# Altium footprint library myLibs.PcbLib: 48 footprints (part 3 of 3)
Each footprint in its own frame and in the unit in brackets; x right, y up, seen from the top. Pads: shape width x height; smd on the part's side, far side on the other; paste and mask are expansions set on the pad; w line width, h text height; cw(c..) or ccw(c..) is an arc to the next point about the centre after c.
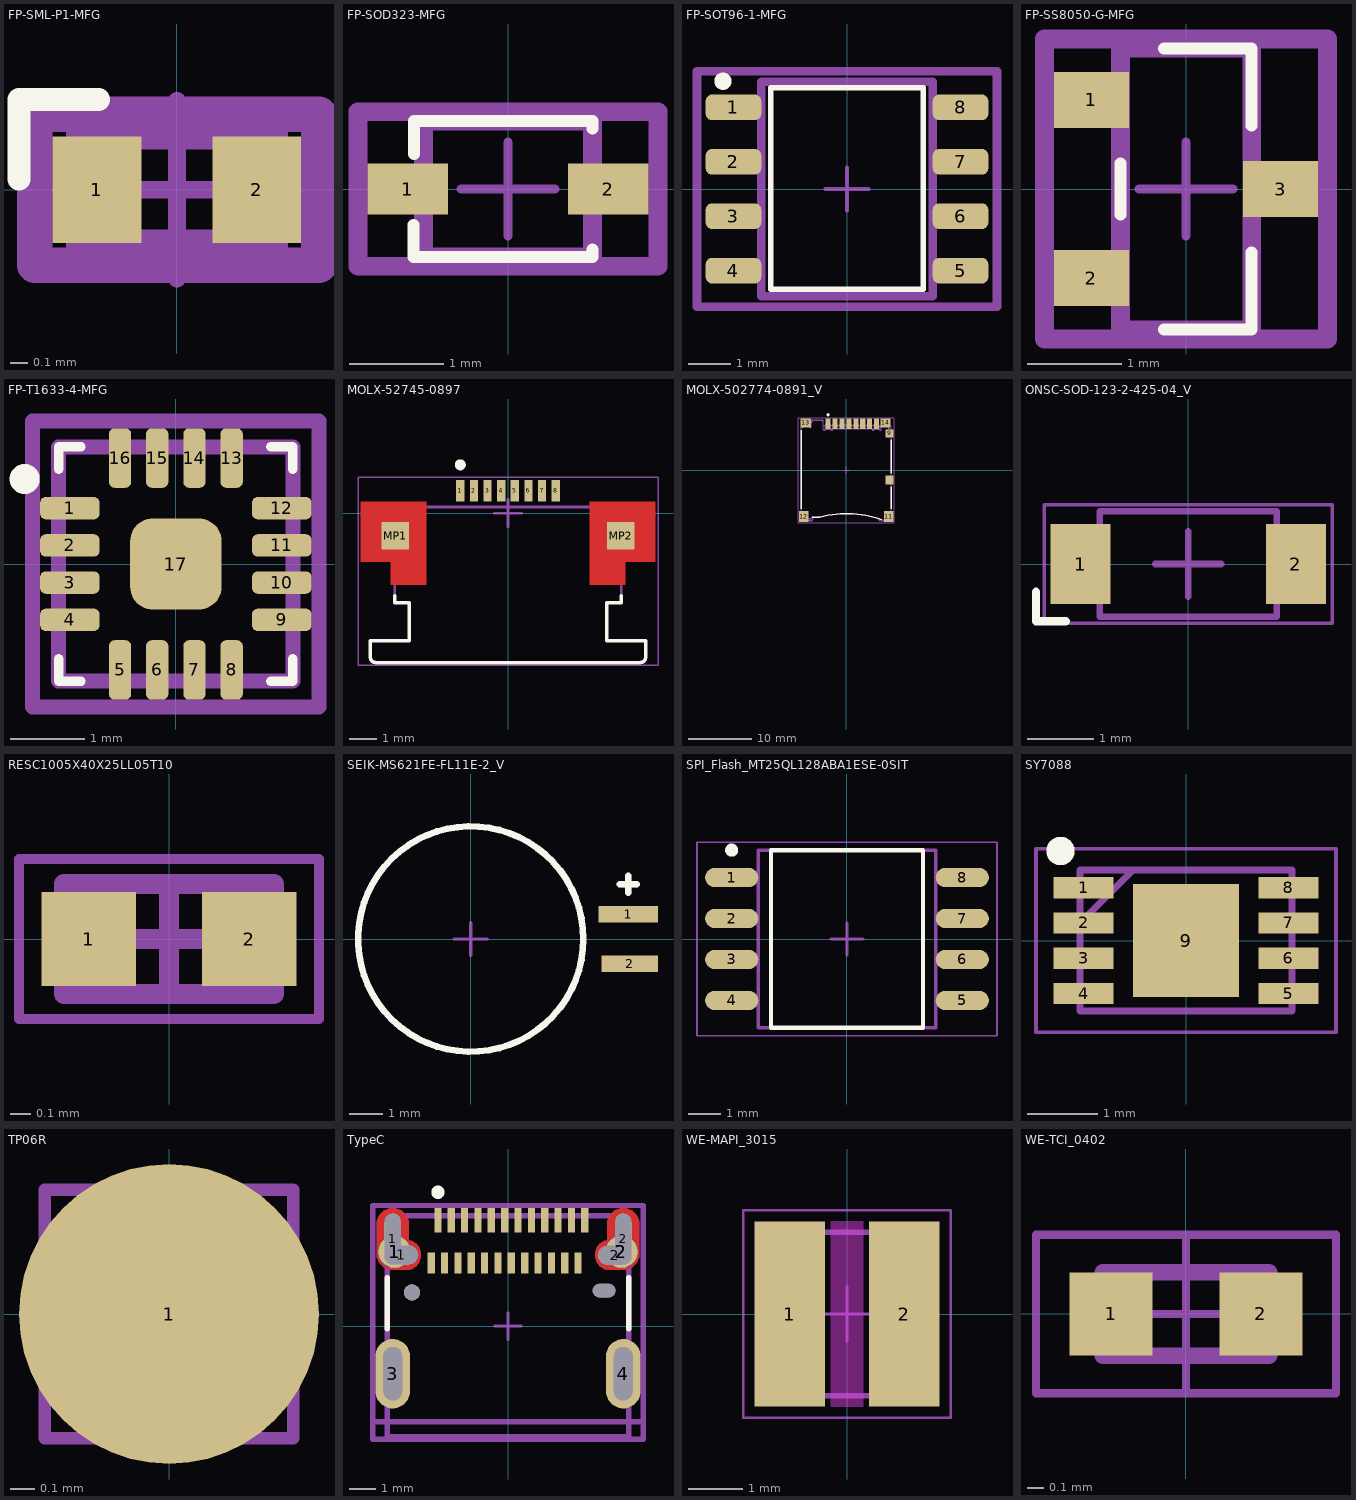
[diagram p2: the footprints below, top view; thin cyan lines are the x and y axes]

## FP-SML-P1-MFG [mm]
pads (2):
  rect 0.5x0.6 smd paste+0 mask+0: 1(-0.45,0) 2(0.45,0)
Top Overlay:
  lines w0.127: -0.889,0.058 -0.889,0.508 -0.439,0.508
Top Assembly:
  lines w0.2: -0.8,-0.425 -0.8,0.425 0.8,0.425 0.8,-0.425 -0.8,-0.425
  text ".Designator" at 0,-0.001 h1
Top 3D Body:
  lines w0.2: -0.525,-0.325 -0.525,0.325 0.525,0.325 0.525,-0.325 -0.525,-0.325
Top Courtyard:
  lines w0.2: -0.8,-0.425 -0.8,0.425 0.8,0.425 0.8,-0.425 -0.8,-0.425
Top Component Center:
  lines w0.1: -0.5,0 0.5,0 ; 0,-0.5 0,0.5
3D body "Diode_Rohm_SML-P13PTT86R_eec.STEP": height 0.25, standoff 0, extent -0.8,-0.425 0.8,0.425

## FP-SOD323-MFG [mm]
pads (2):
  rect 0.86x0.54 smd paste+0 mask+0: 1(-1.07,0) 2(1.07,0)
Top Overlay:
  lines w0.127: -1.008,-0.381 -1.008,-0.725 0.9,-0.725 0.9,-0.645 ; -1.004,0.725 0.9,0.725 0.9,0.645 ; -1.002,0.374 -1.002,0.46 -1.002,0.632 -1.002,0.718
Top Assembly:
  lines w0.2: -1.6,-0.825 1.6,-0.825 1.6,0.825 -1.6,0.825 -1.6,-0.825
  text ".Designator" at -1.778,1.204 h1
Top 3D Body:
  lines w0.2: -0.9,-0.725 0.9,-0.725 0.9,0.725 -0.9,0.725 -0.9,-0.725
Top Courtyard:
  lines w0.2: -1.6,-0.825 1.6,-0.825 1.6,0.825 -1.6,0.825 -1.6,-0.825
Top Component Center:
  lines w0.1: -0.5,0 0.5,0 ; 0,-0.5 0,0.5
3D body "IC_STMicroelectronics_BAT54JFILM_eec.STEP": height 0.25, standoff 0, extent -1.6,-0.825 1.6,0.825

## FP-SOT96-1-MFG [mm]
pads (8):
  rrect50% 1.3x0.6 smd paste+0 mask+0: 1(-2.65,1.905) 2(-2.65,0.635) 3(-2.65,-0.635) 4(-2.65,-1.905) 5(2.65,-1.905) 6(2.65,-0.635) 7(2.65,0.635) 8(2.65,1.905)
Top Overlay:
  circle w0.25: c-2.896,2.515 r0.076
  lines w0.127: -1.778,-2.337 1.778,-2.337 1.778,2.362 -1.778,2.362 -1.778,-2.337
Top Assembly:
  lines w0.2: -3.5,-2.75 -3.5,2.75 3.5,2.75 3.5,-2.75 -3.5,-2.75
  text ".Designator" at 0,0.188 h1
Top 3D Body:
  lines w0.2: -2,-2.5 -2,2.5 2,2.5 2,-2.5 -2,-2.5
Top Courtyard:
  lines w0.2: -3.5,-2.75 -3.5,2.75 3.5,2.75 3.5,-2.75 -3.5,-2.75
Top Component Center:
  lines w0.1: -0.5,0 0.5,0 ; 0,-0.5 0,0.5
3D body "IC_NXP_Semiconductors_PCF8563T-F4_118_eec.STEP": height 0.25, standoff 0, extent -3.5,-2.75 3.5,2.75

## FP-SS8050-G-MFG [mm]
pads (3):
  rect 0.8x0.6 smd paste+0 mask+0: 1(-1.01,0.95) 2(-1.01,-0.95) 3(1.01,0)
Top Overlay:
  lines w0.127: -0.7,-0.275 -0.7,0.275 ; -0.235,-1.5 0.7,-1.5 0.7,-0.675 ; -0.235,1.5 0.7,1.5 0.7,0.675
Top Assembly:
  lines w0.2: -1.51,-1.6 1.51,-1.6 1.51,1.6 -1.51,1.6 -1.51,-1.6
  text ".Designator" at 0,-0.001 h1
Top 3D Body:
  lines w0.2: -0.7,-1.5 0.7,-1.5 0.7,1.5 -0.7,1.5 -0.7,-1.5
Top Courtyard:
  lines w0.2: -1.51,-1.6 1.51,-1.6 1.51,1.6 -1.51,1.6 -1.51,-1.6
Top Component Center:
  lines w0.1: -0.5,0 0.5,0 ; 0,-0.5 0,0.5
3D body "Trans_Comchip_SS8050-G_eec.STEP": height 0.25, standoff 0, extent -1.51,-1.6 1.51,1.6

## FP-T1633-4-MFG [mm]
pads (17):
  rrect50% 0.8x0.3 smd paste+0 mask+0: 1(-1.425,0.75) 2(-1.425,0.25) 3(-1.425,-0.25) 4(-1.425,-0.75) 9(1.425,-0.75) 10(1.425,-0.25) 11(1.425,0.25) 12(1.425,0.75)
  rrect50% 0.3x0.8 smd paste+0 mask+0: 5(-0.75,-1.425) 6(-0.25,-1.425) 7(0.25,-1.425) 8(0.75,-1.425) 13(0.75,1.425) 14(0.25,1.425) 15(-0.25,1.425) 16(-0.75,1.425)
  rrect50% 1.23x1.23 smd paste+0 mask+0: 17(0,0)
Top Overlay:
  circle w0.25: c-2.032,1.143 r0.076
  lines w0.127: -1.575,-1.275 -1.575,-1.575 -1.275,-1.575 ; -1.575,1.275 -1.575,1.575 -1.275,1.575 ; 1.275,-1.575 1.575,-1.575 1.575,-1.275 ; 1.275,1.575 1.575,1.575 1.575,1.275
Top Assembly:
  lines w0.2: -1.925,-1.925 -1.925,1.925 1.925,1.925 1.925,-1.925 -1.925,-1.925
  text ".Designator" at 0,0.188 h1
Top 3D Body:
  lines w0.2: -1.575,-1.575 -1.575,1.575 1.575,1.575 1.575,-1.575 -1.575,-1.575
Top Courtyard:
  lines w0.2: -1.925,-1.925 -1.925,1.925 1.925,1.925 1.925,-1.925 -1.925,-1.925
Top Component Center:
  lines w0.1: -0.5,0 0.5,0 ; 0,-0.5 0,0.5
3D body "IC_Maxim_Integrated_MAX98357AETE+_eec.STEP": height 0.25, standoff 0, extent -1.925,-1.925 1.925,1.925

## MOLX-52745-0897 [mm]
pads (10):
  rect 0.3x0.8 smd: 1(-1.75,0.824) 2(-1.25,0.824) 3(-0.75,0.824) 4(-0.25,0.824) 5(0.25,0.824) 6(0.75,0.824) 7(1.25,0.824) 8(1.75,0.824)
  rect 1x1 smd: MP1(-4.135,-0.824) MP2(4.135,-0.824)
Top Layer:
  region: 3,0.424 5.4,0.424 5.4,-1.776 5.4,-1.777 4.3,-1.777 4.3,-2.626 3,-2.626
  region: -5.4,0.424 -3,0.424 -3,-2.626 -4.3,-2.626 -4.3,-1.777 -4.3,-1.776 -5.4,-1.776
Top Overlay:
  circle w0.25: c-1.75,1.774 r0.076
  lines w0.127: -4.15,-3.026 -4.15,-3.276 -3.625,-3.276 -3.625,-4.676 -5.05,-4.676 -5.05,-5.276 ccw(c-4.85,-5.276) -4.85,-5.476 4.85,-5.476 ccw(c4.85,-5.276) 5.05,-5.276 5.05,-4.676 3.625,-4.676 3.625,-3.276 4.15,-3.276 4.15,-3.026
Top 3D Body:
  lines w0.1: -5.05,-5.276 ccw(c-4.85,-5.276) -4.85,-5.476 4.85,-5.476 ccw(c4.85,-5.276) 5.05,-5.276 5.05,-4.676 3.625,-4.676 3.625,-3.276 4.15,-3.276 4.15,0.224 -4.15,0.224 -4.15,-3.276 -3.625,-3.276 -3.625,-4.676 -5.05,-4.676 -5.049,-4.677 -5.05,-5.276
Top Courtyard:
  lines w0.05: -5.5,-5.576 -5.5,1.324 5.5,1.324 5.5,-5.576 -5.5,-5.576
  lines w0.1: -0.5,0 0.5,0 ; 0,-0.5 0,0.5
3D body "527450897.stp": height 2.01, standoff 0.01, extent -5.05,-5.476 5.05,0.924

## MOLX-502774-0891_V [mm]
pads (14):
  rect 0.8x1.68 smd: 1(-2.9,7.385) 2(-1.8,7.385) 3(-0.7,7.385) 4(0.4,7.385) 5(1.5,7.385) 6(2.6,7.385) 7(3.7,7.385) 8(4.8,7.385)
  rect 1.29x1.3 smd: 9(6.855,5.825)
  rect 1.29x1.4 smd: 10(6.855,-1.575)
  rect 1.5x1.7 smd: 11(6.75,-7.375) 12(-6.75,-7.375)
  rect 1.7x1.5 smd: 13(-6.45,7.475)
  rect 1.6x1.5 smd: 14(6.21,7.475)
Top Overlay:
  circle w0.25: c-2.9,8.775 r0.125
  lines w0.2: -7.15,-6.125 -7.15,6.325 ; -5.41,-7.5 -4.227,-7.5 cw(c0.1,-22.801) 5.598,-7.881 ; 7.15,-6.125 7.15,-2.675 ; 7.15,-0.475 7.15,4.775
Top 3D Body:
  drawing of 232 lines, arcs and shapes, not listed
Top Courtyard:
  lines w0.05: -7.6,-8.325 7.6,-8.325 7.6,8.325 -7.6,8.325 -7.6,-8.325
  lines w0.1: -0.5,0 0.5,0 ; 0,-0.5 0,0.5
3D body "502774-0891.stp": height 1.78, standoff -0.02, extent -7.15,-8 7.15,8

## ONSC-SOD-123-2-425-04_V [mm]
pads (2):
  rect 0.91x1.22 smd: 1(-1.635,0) 2(1.635,0)
Top Overlay:
  lines w0.127: -2.314,-0.421 -2.314,-0.871 -1.864,-0.871
Top 3D Body:
  lines w0.1: -1.345,-0.8 -1.345,0.8 1.345,0.8 1.345,-0.8 -1.345,-0.8
Top Courtyard:
  lines w0.05: -2.19,-0.9 -2.19,0.9 2.19,0.9 2.19,-0.9 -2.19,-0.9
  lines w0.1: -0.5,0 0.5,0 ; 0,-0.5 0,0.5
3D body: height 1.35, standoff 0, extent -1.345,-0.8 1.345,0.8

## RESC1005X40X25LL05T10 [mm]
pads (2):
  rect 0.472x0.468 smd: 1(-0.402,0) 2(0.402,0)
Top 3D Body:
  lines w0.1: -0.525,-0.275 0.525,-0.275 0.525,0.275 -0.525,0.275 -0.525,-0.275
Top Courtyard:
  lines w0.05: -0.75,-0.4 0.75,-0.4 0.75,0.4 -0.75,0.4 -0.75,-0.4
  lines w0.1: -0.275,0 0.275,0 ; 0,-0.275 0,0.275
3D body: height 0.4, standoff 0, extent 0.275,-0.275 0.525,0.275
3D body: height 0.4, standoff 0, extent -0.525,-0.275 -0.275,0.275
3D body: height 0.4, standoff 0, extent -0.275,-0.275 0.275,0.275

## SEIK-MS621FE-FL11E-2_V [mm]
pads (2):
  rect 1.8x0.5 smd: 1(4.75,0.75)
  rect 1.7x0.5 smd: 2(4.8,-0.75)
Top Overlay:
  circle w0.2: c0,0 r3.4
  lines w0.2: 4.5,1.65 5,1.65 ; 4.75,1.4 4.75,1.9
Top 3D Body:
  circle w0.1: c0,0 r3.4
  lines w0.2: 4.5,1.65 5,1.65 ; 4.75,1.4 4.75,1.9
Top Courtyard:
  lines w0.1: -0.5,0 0.5,0 ; 0,-0.5 0,0.5
3D body: height 0.15, standoff 0, extent 3.7,-1 4.35,-0.5
3D body: height 0.15, standoff 0, extent 3.7,0.5 4.35,1
3D body: height 2.7, standoff 2.6, extent -1.397,-1 3.7,1
3D body: height 2.7, standoff 0.15, extent 3.7,-1 3.85,1
3D body: height 2.6, standoff 0, extent -3.399,-3.399 3.399,3.399

## SPI_Flash_MT25QL128ABA1ESE-0SIT [mm] "SOP2, 8-Leads, Body 5.29x5.29mm, Pitch 1.27mm, IPC Medium Density"
height 1.78
pads (8):
  oval 1.65x0.6 smd: 1(-3.575,1.905) 2(-3.575,0.635) 3(-3.575,-0.635) 4(-3.575,-1.905) 5(3.575,-1.905) 6(3.575,-0.635) 7(3.575,0.635) 8(3.575,1.905)
Top Overlay:
  circle w0.25: c-3.575,2.755 r0.076
  lines w0.127: -2.35,-2.75 2.35,-2.75 2.35,2.75 -2.35,2.75 -2.35,-2.75
Top Assembly:
  lines w0.1: -2.75,-2.75 2.75,-2.75 2.75,2.75 -2.75,2.75 -2.75,-2.75
Top Courtyard:
  lines w0.05: -4.65,-3 4.65,-3 4.65,3 -4.65,3 -4.65,-3
  lines w0.1: -0.5,0 0.5,0 ; 0,-0.5 0,0.5
3D body "SOP127P790X178-8N.step": height 1.78, standoff 0, extent -3.95,-2.75 3.95,2.75

## SY7088 [mm]
pads (9):
  rect 0.85x0.3 smd: 1(-1.45,0.75) 2(-1.45,0.25) 3(-1.45,-0.25) 4(-1.45,-0.75) 5(1.45,-0.75) 6(1.45,-0.25) 7(1.45,0.25) 8(1.45,0.75)
  rect 1.5x1.6 smd: 9(0,0)
Top Overlay:
  circle w0.25: c-1.778,1.27 r0.076
Top 3D Body:
  lines w0.1: -1.5,0.25 -0.75,1 ; -1.5,-1 1.5,-1 1.5,1 -1.5,1 -1.5,-1
Top Courtyard:
  lines w0.05: -2.125,-1.3 2.125,-1.3 2.125,1.3 -2.125,1.3 -2.125,-1.3
3D body "SY7088DGC.stp": height 0.9, standoff 0, extent -1.55,-1 1.55,1

## TP06R [mm]
pads (1):
  round 1.207 smd paste-1000 mask+0: 1(0,0)
Top Designator:
  text ".Designator" at -1.27,0.254 h0.6
Top Assembly:
  lines w0.05: -0.5,-0.5 0.5,-0.5 0.5,0.5 -0.5,0.5 -0.5,-0.5

## TypeC [mm]
pads (36):
  rrect100% 0.6x1.9 hole 1.9 slot 0.6 at 0 deg paste-1000 mask+0: 1(-4.32,3.265) 2(4.32,3.265)
  round 1.207 smd far side paste-1000 mask+0: 1(-4.25,2.785) 2(4.25,2.785)
  round 1.207 smd paste-1000 mask+0: 1(-4.25,2.785) 2(4.25,2.785)
  rrect100% 1.25x0.7 hole 0.7 slot 1.25 at 0 deg paste-1000 mask+0: 1(-3.995,2.665) 2(3.995,2.655)
  rrect100% 1.3x2.6 hole 2 slot 0.7 at 0 deg paste-1000 mask+0: 3(-4.32,-1.785) 4(4.32,-1.785)
  rect 0.27x0.9 smd paste+0 mask+0: A1(-2.625,3.965) A2(-2.125,3.965) A3(-1.625,3.965) A4(-1.125,3.965) A5(-0.625,3.965) A6(-0.125,3.965) A7(0.375,3.965) A8(0.875,3.965) A9(1.375,3.965) A10(1.875,3.965) A11(2.375,3.965) A12(2.875,3.965)
  rect 0.27x0.8 smd paste+0 mask+0: B1(2.625,2.365) B2(2.125,2.365) B3(1.625,2.365) B4(1.125,2.365) B5(0.625,2.365) B6(0.125,2.365) B7(-0.375,2.365) B8(-0.875,2.365) B9(-1.375,2.365) B10(-1.875,2.365) B11(-2.375,2.365) B12(-2.875,2.365)
  round 0.6 hole 0.6 unplated paste-1000 mask+0: ""(-3.6,1.265)
  rrect100% 0.85x0.5 hole 0.5 slot 0.85 at 0 deg unplated paste-1000 mask+0: ""(3.6,1.33)
Top Layer:
  region: -4.92,3.815 -4.92,3.934 -4.829,4.155 -4.66,4.324 -4.439,4.415 -4.32,4.415 -4.201,4.415 -3.98,4.324 -3.811,4.155 -3.72,3.934 -3.72,3.815 -3.72,3.215 -3.624,3.197 -3.456,3.098 -3.332,2.947 -3.268,2.763 -3.27,2.665 -3.268,2.57 -3.328,2.388 -3.445,2.238 -3.607,2.136 -3.7,2.115 -4.32,2.115 -4.439,2.115 -4.66,2.206 -4.829,2.375 -4.92,2.596 -4.92,2.715
  region: 4.92,3.815 4.92,3.934 4.829,4.155 4.66,4.324 4.439,4.415 4.32,4.415 4.201,4.415 3.98,4.324 3.811,4.155 3.72,3.934 3.72,3.815 3.72,3.215 3.624,3.197 3.456,3.098 3.332,2.947 3.268,2.763 3.27,2.665 3.268,2.57 3.328,2.388 3.445,2.238 3.607,2.136 3.7,2.115 4.32,2.115 4.439,2.115 4.66,2.206 4.829,2.375 4.92,2.596 4.92,2.715
Bottom Layer:
  region: -4.92,3.815 -4.92,3.934 -4.829,4.155 -4.66,4.324 -4.439,4.415 -4.32,4.415 -4.201,4.415 -3.98,4.324 -3.811,4.155 -3.72,3.934 -3.72,3.815 -3.72,3.215 -3.624,3.197 -3.456,3.098 -3.332,2.947 -3.268,2.763 -3.27,2.665 -3.268,2.57 -3.328,2.388 -3.445,2.238 -3.607,2.136 -3.7,2.115 -4.32,2.115 -4.439,2.115 -4.66,2.206 -4.829,2.375 -4.92,2.596 -4.92,2.715
  region: 4.92,3.815 4.92,3.934 4.829,4.155 4.66,4.324 4.439,4.415 4.32,4.415 4.201,4.415 3.98,4.324 3.811,4.155 3.72,3.934 3.72,3.815 3.72,3.215 3.624,3.197 3.456,3.098 3.332,2.947 3.268,2.763 3.27,2.665 3.268,2.57 3.328,2.388 3.445,2.238 3.607,2.136 3.7,2.115 4.32,2.115 4.439,2.115 4.66,2.206 4.829,2.375 4.92,2.596 4.92,2.715
Top Overlay:
  circle w0.25: c-2.625,5.015 r0.125
  lines w0.2: -4.52,-0.11 -4.52,1.805 ; 4.52,-0.11 4.52,1.805
Top Assembly:
  lines w0.2: -5.07,-4.235 5.07,-4.235 5.07,4.515 -5.07,4.515 -5.07,-4.235
  text ".Designator" at 0,0.328 h1
Top 3D Body:
  lines w0.2: -5.07,-3.585 5.07,-3.585 ; -4.52,-4.135 4.52,-4.135 4.52,4.135 -4.52,4.135 -4.52,-4.135
Top Courtyard:
  lines w0.2: -5.07,-4.235 5.07,-4.235 5.07,4.515 -5.07,4.515 -5.07,-4.235
Top Component Center:
  lines w0.1: -0.5,0 0.5,0 ; 0,-0.5 0,0.5
3D body "Conn_JAE_Electronics_DX07S024JJ3R1300_eec.STEP": height 3.29, standoff -0.75, extent -4.47,-4.085 4.47,4.085

## WE-MAPI_3015 [mm]
pads (2):
  rect 1.3x3.4 smd: 1(-1.05,0) 2(1.05,0)
Top Layer keep-out:
  region: -0.3,1.7 0.3,1.7 0.3,-1.7 -0.3,-1.7
Top Designator:
  text ".Designator" at -4.998,-0.333 h1
Top Component Outline:
  lines w0.1: -1.5,-1.5 1.5,-1.5 1.5,1.5 -1.5,1.5 -1.5,-1.5
Top 3D Body:
  lines w0.1: -1.5,-1.5 -1.5,1.5 1.5,1.5 1.5,-1.5 -1.5,-1.5
Top Courtyard:
  lines w0.05: -0.5,0 0.5,0 ; 0,-0.5 0,0.5 ; -1.9,-1.9 -1.9,1.9 1.9,1.9 1.9,-1.9 -1.9,-1.9
3D body "WE-IndMAPI_30xx.stp": height 1.5, standoff 0, extent -1.5,-1.5 1.5,1.5

## WE-TCI_0402 [mm]
pads (2):
  rect 0.5x0.5 smd: 1(-0.45,0) 2(0.45,0)
Top Designator:
  text ".Designator" at -2.499,-0.167 h0.5
Top Component Outline:
  lines w0.1: -0.5,-0.25 0.5,-0.25 0.5,0.25 -0.5,0.25 -0.5,-0.25
Top Courtyard:
  lines w0.05: -0.5,0 0.5,0 ; 0,-0.475 0,0.475 ; -0.9,-0.475 0.9,-0.475 0.9,0.475 -0.9,0.475 -0.9,-0.475
3D body "0402_744901022.stp": height 0.32, standoff 0, extent -0.5,-0.25 0.5,0.25